# Altium footprint library WR-TBL_Pluggable PCB Header.PcbLib: 719 footprints (part 41 of 45)
Each footprint in its own frame and in the unit in brackets; x right, y up, seen from the top. Pads: shape width x height; smd on the part's side, far side on the other; paste and mask are expansions set on the pad; w line width, h text height; cw(c..) or ccw(c..) is an arc to the next point about the centre after c.
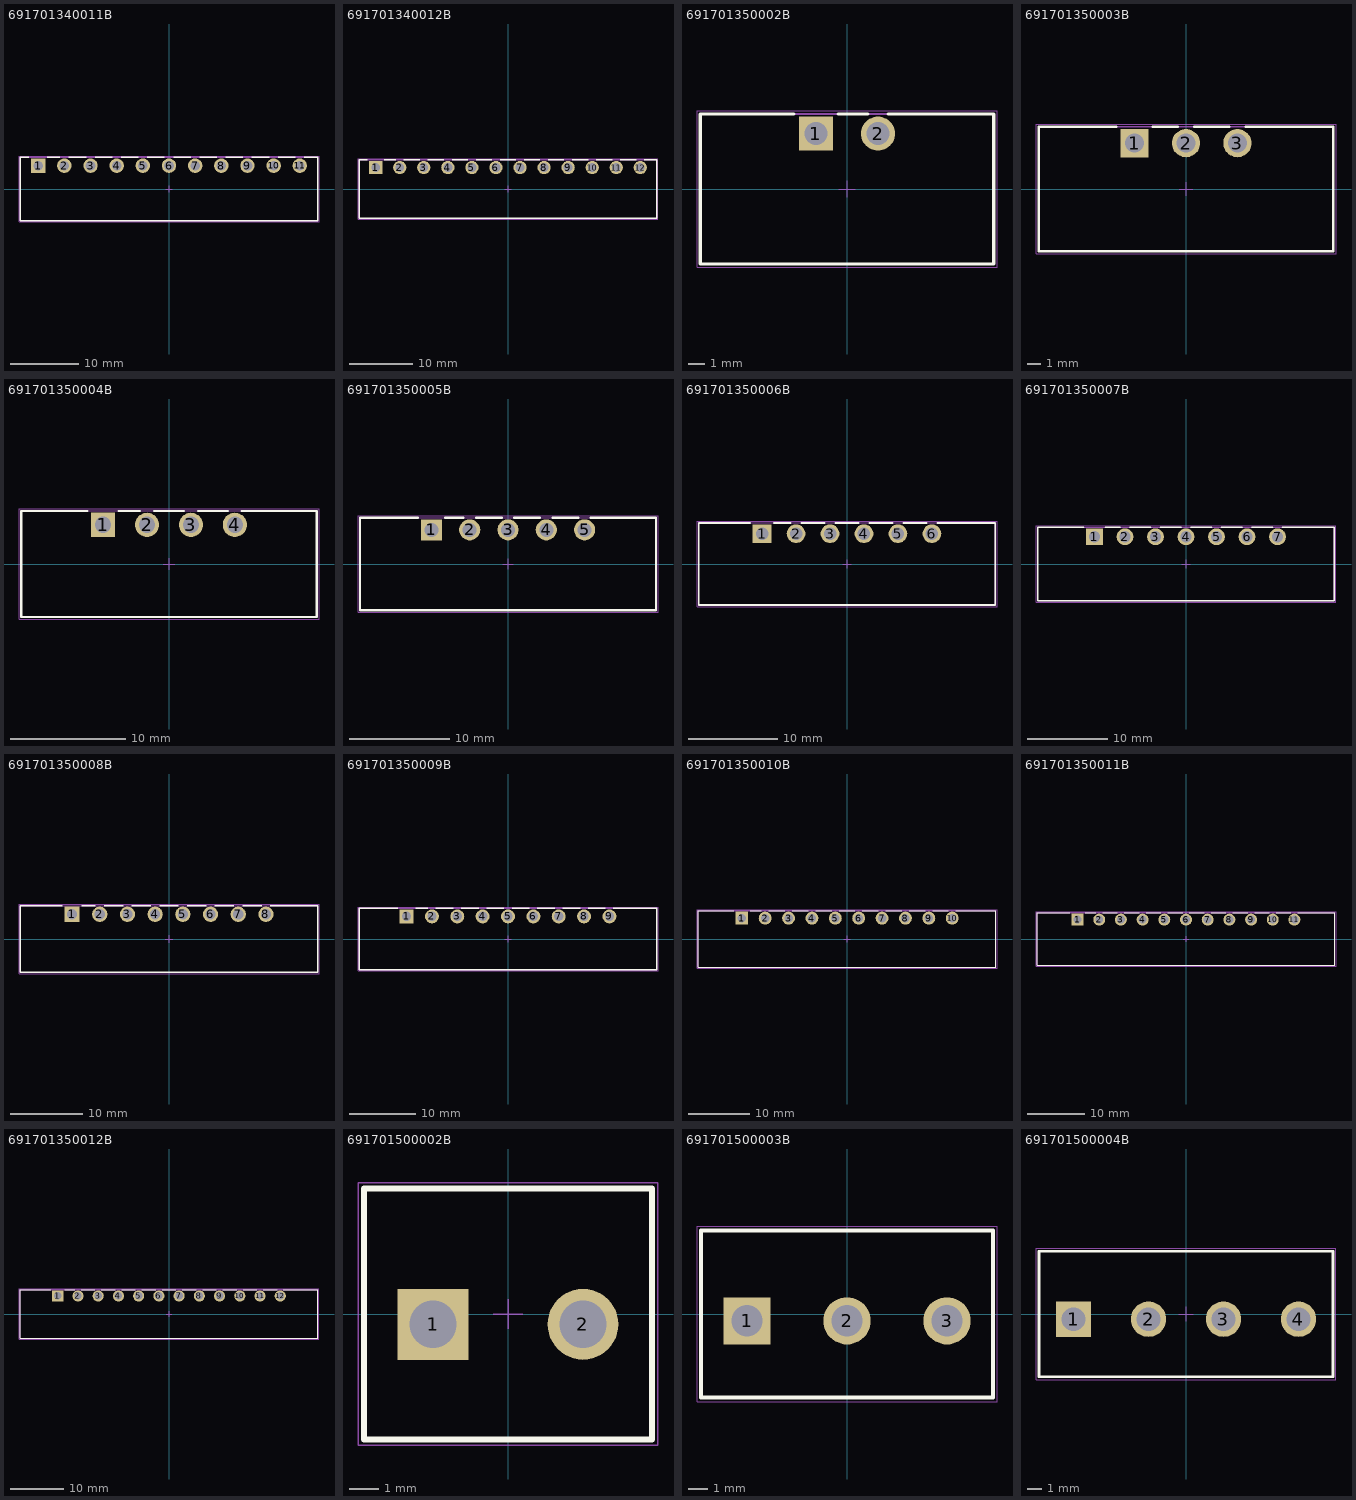
[diagram p40: the footprints below, top view; thin cyan lines are the x and y axes]

## 691701340011B [mm] "Horizontal PCB Header THR Type, pitch 3.81mm, 11p"
height 7.3
pads (11):
  rect 2.1x2.1 hole 1.4: 1(-19.05,3.4)
  round 2.1 hole 1.4: 2(-15.24,3.4) 3(-11.43,3.4) 4(-7.62,3.4) 5(-3.81,3.4) 6(0,3.4) 7(3.81,3.4) 8(7.62,3.4) 9(11.43,3.4) 10(15.24,3.4) 11(19.05,3.4)
Top Overlay:
  lines w0.2: -20.4,4.6 -21.65,4.6 -21.65,-4.6 21.65,-4.6 21.65,4.6 19.71,4.6 ; -17.7,4.6 -15.9,4.6 ; -14.58,4.6 -12.09,4.6 ; -10.77,4.6 -8.28,4.6 ; -6.96,4.6 -4.47,4.6 ; -3.15,4.6 -0.66,4.6 ; 0.66,4.6 3.15,4.6 ; 4.47,4.6 6.96,4.6 ; 8.28,4.6 10.77,4.6 ; 12.09,4.6 14.58,4.6 ; 15.9,4.6 18.39,4.6
Mechanical 13:
  lines w0.1: -21.65,-4.6 -21.65,4.6 21.65,4.6 21.65,-4.6 -21.65,-4.6
Mechanical 15:
  lines w0.05: -0.5,0 0.5,0 ; 0,-0.5 0,0.5 ; -21.85,-4.8 21.85,-4.8 21.85,4.8 -21.85,4.8 -21.85,-4.8
3D body "691701340011B.stp": height 7.4, standoff -2.5, extent -21.65,-4.6 21.65,4.6

## 691701340012B [mm] "Horizontal PCB Header THR Type, pitch 3.81mm, 12p"
height 7.3
pads (12):
  rect 2.1x2.1 hole 1.4: 1(-20.955,3.4)
  round 2.1 hole 1.4: 2(-17.145,3.4) 3(-13.335,3.4) 4(-9.525,3.4) 5(-5.715,3.4) 6(-1.905,3.4) 7(1.905,3.4) 8(5.715,3.4) 9(9.525,3.4) 10(13.335,3.4) 11(17.145,3.4) 12(20.955,3.4)
Top Overlay:
  lines w0.2: -22.305,4.6 -23.555,4.6 -23.555,-4.6 23.555,-4.6 23.555,4.6 21.615,4.6 ; -19.605,4.6 -17.805,4.6 ; -16.485,4.6 -13.995,4.6 ; -12.675,4.6 -10.185,4.6 ; -8.865,4.6 -6.375,4.6 ; -5.055,4.6 -2.565,4.6 ; -1.245,4.6 1.245,4.6 ; 2.565,4.6 5.055,4.6 ; 6.375,4.6 8.865,4.6 ; 10.185,4.6 12.675,4.6 ; 13.995,4.6 16.485,4.6 ; 17.805,4.6 20.295,4.6
Mechanical 13:
  lines w0.1: -23.555,-4.6 -23.555,4.6 23.555,4.6 23.555,-4.6 -23.555,-4.6
Mechanical 15:
  lines w0.05: -0.5,0 0.5,0 ; 0,-0.5 0,0.5 ; -23.755,-4.8 23.755,-4.8 23.755,4.8 -23.755,4.8 -23.755,-4.8
3D body "691701340012B.stp": height 7.4, standoff -2.5, extent -23.555,-4.6 23.555,4.6

## 691701350002B [mm] "Horizontal PCB Header THR Type with Flanges, pitch 3.81mm, 02p"
height 7.3
pads (2):
  rect 2.1x2.1 hole 1.4: 1(-1.905,3.4)
  round 2.1 hole 1.4: 2(1.905,3.4)
Top Overlay:
  lines w0.2: -3.255,4.6 -9.005,4.6 -9.005,-4.6 9.005,-4.6 9.005,4.6 2.515,4.6 ; -0.555,4.6 1.295,4.6
Mechanical 13:
  lines w0.1: -9.005,-4.6 9.005,-4.6 9.005,4.6 -9.005,4.6 -9.005,-4.6
Mechanical 15:
  lines w0.05: -0.5,0 0.5,0 ; 0,-0.5 0,0.5 ; -9.205,-4.8 9.205,-4.8 9.205,4.8 -9.205,4.8 -9.205,-4.8
3D body "691701350002B.stp": height 7.35, standoff -2.55, extent -9.005,-4.6 9.005,4.6

## 691701350003B [mm] "Horizontal PCB Header THR Type with Flanges, pitch 3.81mm, 03p"
height 7.3
pads (3):
  rect 2.1x2.1 hole 1.4: 1(-3.81,3.4)
  round 2.1 hole 1.4: 2(0,3.4) 3(3.81,3.4)
Top Overlay:
  lines w0.2: -5.16,4.6 -10.91,4.6 -10.91,-4.6 10.91,-4.6 10.91,4.6 4.42,4.6 ; -2.46,4.6 -0.61,4.6 ; 0.61,4.6 3.2,4.6
Mechanical 13:
  lines w0.1: -10.91,-4.6 -10.91,4.6 10.91,4.6 10.91,-4.6 -10.91,-4.6
Mechanical 15:
  lines w0.05: -0.5,0 0.5,0 ; 0,-0.5 0,0.5 ; -11.11,-4.8 -11.11,4.8 11.11,4.8 11.11,-4.8 -11.11,-4.8
3D body "691701350003B.stp": height 7.35, standoff -2.55, extent -10.91,-4.6 10.91,4.6

## 691701350004B [mm] "Horizontal PCB Header THR Type with Flanges, pitch 3.81mm, 04p"
height 7.3
pads (4):
  rect 2.1x2.1 hole 1.4: 1(-5.715,3.4)
  round 2.1 hole 1.4: 2(-1.905,3.4) 3(1.905,3.4) 4(5.715,3.4)
Top Overlay:
  lines w0.2: -7.065,4.6 -12.815,4.6 -12.815,-4.6 12.815,-4.6 12.815,4.6 6.325,4.6 ; -4.365,4.6 -2.515,4.6 ; -1.295,4.6 1.295,4.6 ; 2.515,4.6 5.105,4.6
Mechanical 13:
  lines w0.1: -12.815,-4.6 -12.815,4.6 12.815,4.6 12.815,-4.6 -12.815,-4.6
Mechanical 15:
  lines w0.05: -0.5,0 0.5,0 ; 0,-0.5 0,0.5 ; -13.015,-4.8 -13.015,4.8 13.015,4.8 13.015,-4.8 -13.015,-4.8
3D body "691701350004B.stp": height 7.35, standoff -2.55, extent -12.815,-4.6 12.815,4.6

## 691701350005B [mm] "Horizontal PCB Header THR Type with Flanges, pitch 3.81mm, 05p"
height 7.3
pads (5):
  rect 2.1x2.1 hole 1.4: 1(-7.62,3.4)
  round 2.1 hole 1.4: 2(-3.81,3.4) 3(0,3.4) 4(3.81,3.4) 5(7.62,3.4)
Top Overlay:
  lines w0.2: -8.97,4.6 -14.72,4.6 -14.72,-4.6 14.72,-4.6 14.72,4.6 8.23,4.6 ; -6.27,4.6 -4.42,4.6 ; -3.2,4.6 -0.61,4.6 ; 0.61,4.6 3.2,4.6 ; 4.42,4.6 7.01,4.6
Mechanical 13:
  lines w0.1: -14.72,-4.6 14.72,-4.6 14.72,4.6 -14.72,4.6 -14.72,-4.6
Mechanical 15:
  lines w0.05: -0.5,0 0.5,0 ; 0,-0.5 0,0.5 ; -14.92,-4.8 14.92,-4.8 14.92,4.8 -14.92,4.8 -14.92,-4.8
3D body "691701350005B.stp": height 7.35, standoff -2.55, extent -14.72,-4.6 14.72,4.6

## 691701350006B [mm] "Horizontal PCB Header THR Type with Flanges, pitch 3.81mm, 06p"
height 7.3
pads (6):
  rect 2.1x2.1 hole 1.4: 1(-9.525,3.4)
  round 2.1 hole 1.4: 2(-5.715,3.4) 3(-1.905,3.4) 4(1.905,3.4) 5(5.715,3.4) 6(9.525,3.4)
Top Overlay:
  lines w0.2: -10.875,4.6 -16.625,4.6 -16.625,-4.6 16.625,-4.6 16.625,4.6 10.135,4.6 ; -8.175,4.6 -6.325,4.6 ; -5.105,4.6 -2.515,4.6 ; -1.295,4.6 1.295,4.6 ; 2.515,4.6 5.105,4.6 ; 6.325,4.6 8.915,4.6
Mechanical 13:
  lines w0.1: -16.625,-4.6 16.625,-4.6 16.625,4.6 -16.625,4.6 -16.625,-4.6
Mechanical 15:
  lines w0.05: -0.5,0 0.5,0 ; 0,-0.5 0,0.5 ; -16.825,-4.8 16.825,-4.8 16.825,4.8 -16.825,4.8 -16.825,-4.8
3D body "691701350006B.stp": height 7.35, standoff -2.55, extent -16.625,-4.6 16.625,4.6

## 691701350007B [mm] "Horizontal PCB Header THR Type with Flanges, pitch 3.81mm, 07p"
height 7.3
pads (7):
  rect 2.1x2.1 hole 1.4: 1(-11.43,3.4)
  round 2.1 hole 1.4: 2(-7.62,3.4) 3(-3.81,3.4) 4(0,3.4) 5(3.81,3.4) 6(7.62,3.4) 7(11.43,3.4)
Top Overlay:
  lines w0.2: -12.78,4.6 -18.53,4.6 -18.53,-4.6 18.53,-4.6 18.53,4.6 12.04,4.6 ; -10.08,4.6 -8.23,4.6 ; -7.01,4.6 -4.42,4.6 ; -3.2,4.6 -0.61,4.6 ; 0.61,4.6 3.2,4.6 ; 4.42,4.6 7.01,4.6 ; 8.23,4.6 10.82,4.6
Mechanical 13:
  lines w0.1: -18.53,-4.6 -18.53,4.6 18.53,4.6 18.53,-4.6 -18.53,-4.6
Mechanical 15:
  lines w0.05: -0.5,0 0.5,0 ; 0,-0.5 0,0.5 ; -18.73,-4.8 -18.73,4.8 18.73,4.8 18.73,-4.8 -18.73,-4.8
3D body "691701350007B.stp": height 7.35, standoff -2.55, extent -18.53,-4.6 18.53,4.6

## 691701350008B [mm] "Horizontal PCB Header THR Type with Flanges, pitch 3.81mm, 08p"
height 7.3
pads (8):
  rect 2.1x2.1 hole 1.4: 1(-13.335,3.4)
  round 2.1 hole 1.4: 2(-9.525,3.4) 3(-5.715,3.4) 4(-1.905,3.4) 5(1.905,3.4) 6(5.715,3.4) 7(9.525,3.4) 8(13.335,3.4)
Top Overlay:
  lines w0.2: -14.685,4.6 -20.435,4.6 -20.435,-4.6 20.435,-4.6 20.435,4.6 13.945,4.6 ; -11.985,4.6 -10.135,4.6 ; -8.915,4.6 -6.325,4.6 ; -5.105,4.6 -2.515,4.6 ; -1.295,4.6 1.295,4.6 ; 2.515,4.6 5.105,4.6 ; 6.325,4.6 8.915,4.6 ; 10.135,4.6 12.725,4.6
Mechanical 13:
  lines w0.1: -20.435,-4.6 -20.435,4.6 20.435,4.6 20.435,-4.6 -20.435,-4.6
Mechanical 15:
  lines w0.05: -0.5,0 0.5,0 ; 0,-0.5 0,0.5 ; -20.635,-4.8 -20.635,4.8 20.635,4.8 20.635,-4.8 -20.635,-4.8
3D body "691701350008B.stp": height 7.35, standoff -2.55, extent -20.435,-4.6 20.435,4.6

## 691701350009B [mm] "Horizontal PCB Header THR Type with Flanges, pitch 3.81mm, 09p"
height 7.3
pads (9):
  rect 2.1x2.1 hole 1.4: 1(-15.24,3.4)
  round 2.1 hole 1.4: 2(-11.43,3.4) 3(-7.62,3.4) 4(-3.81,3.4) 5(0,3.4) 6(3.81,3.4) 7(7.62,3.4) 8(11.43,3.4) 9(15.24,3.4)
Top Overlay:
  lines w0.2: -16.59,4.6 -22.34,4.6 -22.34,-4.6 22.34,-4.6 22.34,4.6 15.85,4.6 ; -13.89,4.6 -12.04,4.6 ; -10.82,4.6 -8.23,4.6 ; -7.01,4.6 -4.42,4.6 ; -3.2,4.6 -0.61,4.6 ; 0.61,4.6 3.2,4.6 ; 4.42,4.6 7.01,4.6 ; 8.23,4.6 10.82,4.6 ; 12.04,4.6 14.63,4.6
Mechanical 13:
  lines w0.1: -22.34,-4.6 22.34,-4.6 22.34,4.6 -22.34,4.6 -22.34,-4.6
Mechanical 15:
  lines w0.05: -0.5,0 0.5,0 ; 0,-0.5 0,0.5 ; -22.54,-4.8 22.54,-4.8 22.54,4.8 -22.54,4.8 -22.54,-4.8
3D body "691701350009B.stp": height 7.35, standoff -2.55, extent -22.34,-4.6 22.34,4.6

## 691701350010B [mm] "Horizontal PCB Header THR Type with Flanges, pitch 3.81mm, 10p"
height 7.3
pads (10):
  rect 2.1x2.1 hole 1.4: 1(-17.145,3.4)
  round 2.1 hole 1.4: 2(-13.335,3.4) 3(-9.525,3.4) 4(-5.715,3.4) 5(-1.905,3.4) 6(1.905,3.4) 7(5.715,3.4) 8(9.525,3.4) 9(13.335,3.4) 10(17.145,3.4)
Top Overlay:
  lines w0.2: -18.495,4.6 -24.245,4.6 -24.245,-4.6 24.245,-4.6 24.245,4.6 17.755,4.6 ; -15.795,4.6 -13.945,4.6 ; -12.725,4.6 -10.135,4.6 ; -8.915,4.6 -6.325,4.6 ; -5.105,4.6 -2.515,4.6 ; -1.295,4.6 1.295,4.6 ; 2.515,4.6 5.105,4.6 ; 6.325,4.6 8.915,4.6 ; 10.135,4.6 12.725,4.6 ; 13.945,4.6 16.535,4.6
Mechanical 13:
  lines w0.1: -24.245,-4.6 -24.245,4.6 24.245,4.6 24.245,-4.6 -24.245,-4.6
Mechanical 15:
  lines w0.05: -0.5,0 0.5,0 ; 0,-0.5 0,0.5 ; -24.445,-4.8 -24.445,4.8 24.445,4.8 24.445,-4.8 -24.445,-4.8
3D body "691701350010B.stp": height 7.35, standoff -2.55, extent -24.245,-4.6 24.245,4.6

## 691701350011B [mm] "Horizontal PCB Header THR Type with Flanges, pitch 3.81mm, 11p"
height 7.3
pads (11):
  rect 2.1x2.1 hole 1.4: 1(-19.05,3.4)
  round 2.1 hole 1.4: 2(-15.24,3.4) 3(-11.43,3.4) 4(-7.62,3.4) 5(-3.81,3.4) 6(0,3.4) 7(3.81,3.4) 8(7.62,3.4) 9(11.43,3.4) 10(15.24,3.4) 11(19.05,3.4)
Top Overlay:
  lines w0.2: -20.4,4.6 -26.15,4.6 -26.15,-4.6 26.15,-4.6 26.15,4.6 19.66,4.6 ; -17.7,4.6 -15.85,4.6 ; -14.63,4.6 -12.04,4.6 ; -10.82,4.6 -8.23,4.6 ; -7.01,4.6 -4.42,4.6 ; -3.2,4.6 -0.61,4.6 ; 0.61,4.6 3.2,4.6 ; 4.42,4.6 7.01,4.6 ; 8.23,4.6 10.82,4.6 ; 12.04,4.6 14.63,4.6 ; 15.85,4.6 18.44,4.6
Mechanical 13:
  lines w0.1: -26.15,-4.6 26.15,-4.6 26.15,4.6 -26.15,4.6 -26.15,-4.6
Mechanical 15:
  lines w0.05: -0.5,0 0.5,0 ; 0,-0.5 0,0.5 ; -26.35,-4.8 26.35,-4.8 26.35,4.8 -26.35,4.8 -26.35,-4.8
3D body "691701350011B.stp": height 7.35, standoff -2.55, extent -26.15,-4.6 26.15,4.6

## 691701350012B [mm] "Horizontal PCB Header THR Type with Flanges, pitch 3.81mm, 12p"
height 7.3
pads (12):
  rect 2.1x2.1 hole 1.4: 1(-20.955,3.4)
  round 2.1 hole 1.4: 2(-17.145,3.4) 3(-13.335,3.4) 4(-9.525,3.4) 5(-5.715,3.4) 6(-1.905,3.4) 7(1.905,3.4) 8(5.715,3.4) 9(9.525,3.4) 10(13.335,3.4) 11(17.145,3.4) 12(20.955,3.4)
Top Overlay:
  lines w0.2: -22.305,4.6 -28.055,4.6 -28.055,-4.6 28.055,-4.6 28.055,4.6 21.565,4.6 ; -19.605,4.6 -17.755,4.6 ; -16.535,4.6 -13.945,4.6 ; -12.725,4.6 -10.135,4.6 ; -8.915,4.6 -6.325,4.6 ; -5.105,4.6 -2.515,4.6 ; -1.295,4.6 1.295,4.6 ; 2.515,4.6 5.105,4.6 ; 6.325,4.6 8.915,4.6 ; 10.135,4.6 12.725,4.6 ; 13.945,4.6 16.535,4.6 ; 17.755,4.6 20.345,4.6
Mechanical 13:
  lines w0.1: -28.055,-4.6 -28.055,4.6 28.055,4.6 28.055,-4.6 -28.055,-4.6
Mechanical 15:
  lines w0.05: -0.5,0 0.5,0 ; 0,-0.5 0,0.5 ; -28.255,-4.8 -28.255,4.8 28.255,4.8 28.255,-4.8 -28.255,-4.8
3D body "691701350012B.stp": height 7.35, standoff -2.55, extent -28.055,-4.6 28.055,4.6

## 691701500002B [mm] "THR - 5,08mm - PCB Vertical Open - 02p"
height 12
pads (2):
  rect 2.4x2.4 hole 1.6: 1(-2.54,-0.35)
  round 2.4 hole 1.6: 2(2.54,-0.35)
Top Overlay:
  lines w0.2: -4.88,-4.25 4.88,-4.25 4.88,4.25 -4.88,4.25 -4.88,-4.25
Mechanical 13:
  lines w0.1: -4.88,-4.25 -4.88,4.25 4.88,4.25 4.88,-4.25 -4.88,-4.25
Mechanical 15:
  lines w0.05: -0.5,0 0.5,0 ; 0,-0.5 0,0.5 ; -5.08,-4.45 5.08,-4.45 5.08,4.45 -5.08,4.45 -5.08,-4.45
3D body "691701500002B.stp": height 12.05, standoff -2.55, extent -4.88,-4.25 4.88,4.25

## 691701500003B [mm] "THR - 5,08mm - PCB Vertical Open - 03p"
height 12
pads (3):
  rect 2.4x2.4 hole 1.6: 1(-5.08,-0.35)
  round 2.4 hole 1.6: 2(0,-0.35) 3(5.08,-0.35)
Top Overlay:
  lines w0.2: -7.42,-4.25 -7.42,4.25 7.42,4.25 7.42,-4.25 -7.42,-4.25
Mechanical 13:
  lines w0.1: -7.42,-4.25 7.42,-4.25 7.42,4.25 -7.42,4.25 -7.42,-4.25
Mechanical 15:
  lines w0.05: -0.5,0 0.5,0 ; 0,-0.5 0,0.5 ; -7.62,-4.45 -7.62,4.45 7.62,4.45 7.62,-4.45 -7.62,-4.45
3D body "691701500003B.stp": height 12.05, standoff -2.55, extent -7.42,-4.25 7.42,4.25

## 691701500004B [mm] "THR - 5,08mm - PCB Vertical Open - 04p"
height 12
pads (4):
  rect 2.4x2.4 hole 1.6: 1(-7.62,-0.35)
  round 2.4 hole 1.6: 2(-2.54,-0.35) 3(2.54,-0.35) 4(7.62,-0.35)
Top Overlay:
  lines w0.2: -9.96,-4.25 -9.96,4.25 9.96,4.25 9.96,-4.25 -9.96,-4.25
Mechanical 13:
  lines w0.1: -9.96,-4.25 9.96,-4.25 9.96,4.25 -9.96,4.25 -9.96,-4.25
Mechanical 15:
  lines w0.05: -0.5,0 0.5,0 ; 0,-0.5 0,0.5 ; -10.16,-4.45 -10.16,4.45 10.16,4.45 10.16,-4.45 -10.16,-4.45
3D body "691701500004B.stp": height 12.05, standoff -2.55, extent -9.96,-4.25 9.96,4.25